# Altium footprint library Connectors_Old.PcbLib: 246 footprints (part 2 of 18)
Each footprint in its own frame and in the unit in brackets; x right, y up, seen from the top. Pads: shape width x height; smd on the part's side, far side on the other; paste and mask are expansions set on the pad; w line width, h text height; cw(c..) or ccw(c..) is an arc to the next point about the centre after c.
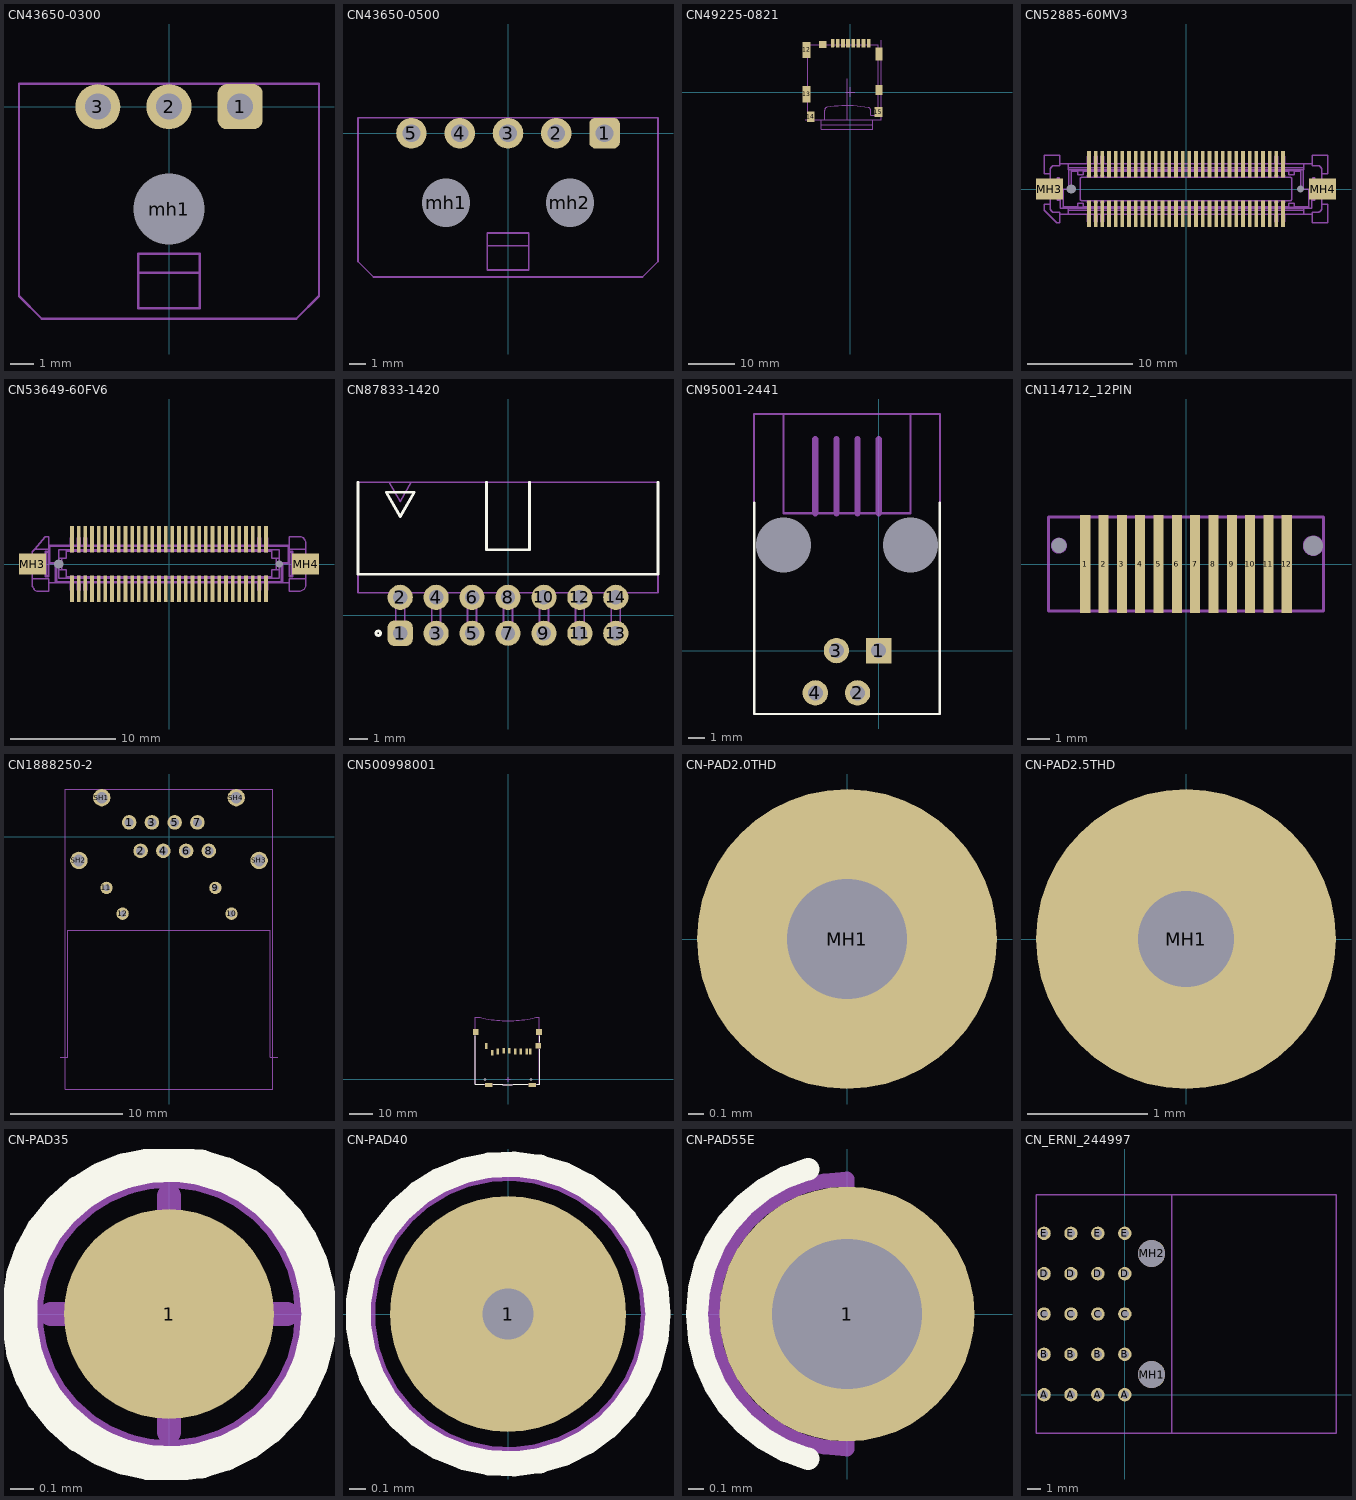
[diagram p1: the footprints below, top view; thin cyan lines are the x and y axes]

## CN43650-0300 [mm] "CN 3 pin Male horizontal THT R3.0"
height 9.4
pads (4):
  rrect40% 1.9x1.9 hole 1.1: 1(3,0)
  round 1.9 hole 1.1: 2(0,0) 3(-3,0)
  round 2.9 hole 3 unplated mask+0.2: mh1(0,-4.318)
Mechanical 13:
  lines w0.1: -1.3,-7 1.3,-7 ; -6.322,-7.978 -5.362,-8.938 5.362,-8.938 6.322,-7.978 6.322,0.962 -6.322,0.962 -6.322,-7.978 ; -1.3,-8.5 -1.3,-6.2 1.3,-6.2 1.3,-8.5 -1.3,-8.5
3D body: height 5.59, standoff -3.16, extent -6.325,-8.938 6.325,0.962

## CN43650-0500 [mm] "CN 5 pin Male horizontal THT R3.0"
height 9.4
pads (7):
  rrect40% 1.9x1.9 hole 1.1: 1(6,0)
  round 1.9 hole 1.1: 2(3,0) 3(0,0) 4(-3,0) 5(-6,0)
  round 2.9 hole 3 unplated mask+0.2: mh1(-3.85,-4.318) mh2(3.85,-4.318)
Mechanical 13:
  lines w0.1: -1.3,-7 1.3,-7 ; -9.322,-7.978 -8.362,-8.938 8.362,-8.938 9.322,-7.978 9.322,0.962 -9.322,0.962 -9.322,-7.978 ; -1.3,-8.5 -1.3,-6.2 1.3,-6.2 1.3,-8.5 -1.3,-8.5
3D body: height 5.59, standoff -3.16, extent -9.32,-8.938 9.32,0.962

## CN49225-0821 [mm] "Molex micro SD 49225-0821"
height 2
pads (15):
  rrect50% 0.8x1.8 smd: 1(-3.75,10.475)
  rect 0.8x1.8 smd: 2(-2.65,10.475) 3(-1.55,10.475) 4(-0.45,10.475) 5(0.65,10.475) 6(1.75,10.475) 7(2.85,10.475) 8(3.95,10.475)
  rect 1.55x2.1 smd: 9(6.15,0.45)
  rect 1.55x2.8 smd: 10(6.15,8.15)
  rect 1.6x1.55 smd: 11(-5.85,10.2)
  rect 1.7x3.4 smd: 12(-9.35,9.05)
  rect 1.7x3.6 smd: 13(-9.35,-0.475)
  rect 1.7x2.2 smd: 14(-8.45,-5.275) 15(6.05,-4.275)
Mechanical 13:
  lines w0.1: -9.15,-1.7 -9.625,-1.7 -9.75,-1.575 -9.75,0.575 -9.625,0.7 -9.15,0.7 ; -9.15,7.95 -9.625,7.95 -9.75,8.075 -9.75,10.025 -9.615,10.16 -9.15,10.16 ; -8.35,-4.65 -8.9,-4.65 -9.05,-4.8 -9.05,-5.8 -8.91,-5.94 -8.35,-5.94 ; -6.45,10.16 -6.45,10.55 -6.35,10.65 -5.55,10.65 -5.45,10.55 -5.45,10.16 ; 3.899,-3.355 cw(c3.825,-3.925) 4.4,-3.925 4.4,-4.94 6.05,-4.94 6.21,-4.94 6.35,-4.8 6.35,-3.8 6.2,-3.65 5.65,-3.65 ; 3.9,-3.353 ccw(c-0.684,-27.93) -4.999,-3.305 ccw(c-4.925,-3.875) -5.5,-3.875 -5.5,-5.94 -8.35,-5.94 ; 5.65,-4.94 5.65,-3.525 6.05,-3.525 6.05,10.16 -9.15,10.16 ; 6.05,-0.3 6.25,-0.3 6.35,-0.2 6.35,1.1 6.25,1.2 6.05,1.2 ; 6.05,7.05 6.25,7.05 6.35,7.15 6.35,8.95 6.25,9.05 6.05,9.05 ; -9.15,10.16 -9.15,-4.525 -8.35,-4.525 -8.35,-5.94
Mechanical 15:
  lines w0.1: -9.6,-5.94 6.65,-5.94 6.65,11.1 ; -6.18,-7 4.82,-7 ; -6.18,-5.99 -6.18,-7.95 4.82,-7.95 4.82,-5.94 ; -0.68,-6 -0.68,2.9
  lines w0.127: -1,0 1,0 ; 0,-1 0,1
  text "CARD LOCKED" at -4.35,-7.825 h0.7
  text "CARD PUSHED" at -4.375,-6.825 h0.7
3D body: height 1.99, standoff 0.01, extent -9.6,-5.94 6.5,11.11

## CN52885-60MV3 [mm] "Molex 52885 60pin vertical male 3mm R0.635mm"
height 3
pads (64):
  rect 0.35x2.5 smd: 1(-9.207,-2.35) 2(-9.207,2.35) 3(-8.572,-2.35) 4(-8.572,2.35) 5(-7.938,-2.35) 6(-7.938,2.35) 7(-7.302,-2.35) 8(-7.302,2.35) 9(-6.667,-2.35) 10(-6.667,2.35) 11(-6.032,-2.35) 12(-6.032,2.35) 13(-5.397,-2.35) 14(-5.397,2.35) 15(-4.763,-2.35) 16(-4.763,2.35) 17(-4.127,-2.35) 18(-4.127,2.35) 19(-3.492,-2.35) 20(-3.492,2.35) 21(-2.857,-2.35) 22(-2.857,2.35) 23(-2.222,-2.35) 24(-2.222,2.35) 25(-1.587,-2.35) 26(-1.587,2.35) 27(-0.953,-2.35) 28(-0.953,2.35) 29(-0.318,-2.35) 30(-0.318,2.35) 31(0.318,-2.35) 32(0.318,2.35) 33(0.953,-2.35) 34(0.953,2.35) 35(1.587,-2.35) 36(1.587,2.35) 37(2.222,-2.35) 38(2.222,2.35) 39(2.857,-2.35) 40(2.857,2.35) 41(3.492,-2.35) 42(3.492,2.35) 43(4.127,-2.35) 44(4.127,2.35) 45(4.763,-2.35) 46(4.763,2.35) 47(5.397,-2.35) 48(5.397,2.35) 49(6.032,-2.35) 50(6.032,2.35) 51(6.667,-2.35) 52(6.667,2.35) 53(7.302,-2.35) 54(7.302,2.35) 55(7.938,-2.35) 56(7.938,2.35) 57(8.572,-2.35) 58(8.572,2.35) 59(9.207,-2.35) 60(9.207,2.35)
  round 0 hole 0.9 unplated mask+0.7: MH1(-10.86,0)
  round 0 hole 0.7 unplated mask+0.6: MH2(10.86,0)
  rect 2.55x2 smd: MH3(-12.95,0) MH4(12.95,0)
Mechanical 13:
  drawing of 301 lines, arcs and shapes, not listed
3D body: height 3.2, standoff 0.8, extent 9.053,1.098 9.353,1.298
3D body: height 3.2, standoff 0.8, extent 9.049,-1.3 9.349,-1.1
3D body: height 3.2, standoff 0.8, extent 8.418,1.098 8.718,1.298
3D body: height 3.2, standoff 0.8, extent 8.414,-1.3 8.714,-1.1
3D body: height 3.2, standoff 0.8, extent 7.783,1.098 8.083,1.298
3D body: height 3.2, standoff 0.8, extent 7.779,-1.3 8.079,-1.1
3D body: height 3.2, standoff 0.8, extent 7.148,1.098 7.448,1.298
3D body: height 3.2, standoff 0.8, extent 7.144,-1.3 7.444,-1.1
3D body: height 3.2, standoff 0.8, extent 6.513,1.098 6.813,1.298
3D body: height 3.2, standoff 0.8, extent 6.509,-1.3 6.809,-1.1
3D body: height 3.2, standoff 0.8, extent 5.878,1.098 6.178,1.298
3D body: height 3.2, standoff 0.8, extent 5.874,-1.3 6.174,-1.1
3D body: height 3.2, standoff 0.8, extent 5.243,1.098 5.543,1.298
3D body: height 3.2, standoff 0.8, extent 5.239,-1.3 5.539,-1.1
3D body: height 3.2, standoff 0.8, extent 4.608,1.098 4.908,1.298
3D body: height 3.2, standoff 0.8, extent 4.604,-1.3 4.904,-1.1
3D body: height 3.2, standoff 0.8, extent 3.973,1.098 4.273,1.298
3D body: height 3.2, standoff 0.8, extent 3.969,-1.3 4.269,-1.1
3D body: height 3.2, standoff 0.8, extent 3.338,1.098 3.638,1.298
3D body: height 3.2, standoff 0.8, extent 3.334,-1.3 3.634,-1.1
3D body: height 3.2, standoff 0.8, extent 2.703,1.098 3.003,1.298
3D body: height 3.2, standoff 0.8, extent 2.699,-1.3 2.999,-1.1
3D body: height 3.2, standoff 0.8, extent 2.068,1.098 2.368,1.298
3D body: height 3.2, standoff 0.8, extent 2.064,-1.3 2.364,-1.1
3D body: height 3.2, standoff 0.8, extent 1.433,1.098 1.733,1.298
3D body: height 3.2, standoff 0.8, extent 1.429,-1.3 1.729,-1.1
3D body: height 3.2, standoff 0.8, extent 0.798,1.098 1.098,1.298
3D body: height 3.2, standoff 0.8, extent 0.794,-1.3 1.094,-1.1
3D body: height 3.2, standoff 0.8, extent 0.163,1.098 0.463,1.298
3D body: height 3.2, standoff 0.8, extent 0.159,-1.3 0.459,-1.1
3D body: height 3.2, standoff 0.8, extent -0.472,1.098 -0.172,1.298
3D body: height 3.2, standoff 0.8, extent -0.476,-1.3 -0.176,-1.1
3D body: height 3.2, standoff 0.8, extent -1.107,1.098 -0.807,1.298
3D body: height 3.2, standoff 0.8, extent -1.111,-1.3 -0.811,-1.1
3D body: height 3.2, standoff 0.8, extent -1.742,1.098 -1.442,1.298
3D body: height 3.2, standoff 0.8, extent -1.746,-1.3 -1.446,-1.1
3D body: height 3.2, standoff 0.8, extent -2.377,1.098 -2.077,1.298
3D body: height 3.2, standoff 0.8, extent -2.381,-1.3 -2.081,-1.1
3D body: height 3.2, standoff 0.8, extent -3.012,1.098 -2.712,1.298
3D body: height 3.2, standoff 0.8, extent -3.016,-1.3 -2.716,-1.1
3D body: height 3.2, standoff 0.8, extent -3.647,1.098 -3.347,1.298
3D body: height 3.2, standoff 0.8, extent -3.651,-1.3 -3.351,-1.1
3D body: height 3.2, standoff 0.8, extent -4.282,1.098 -3.982,1.298
3D body: height 3.2, standoff 0.8, extent -4.286,-1.3 -3.986,-1.1
3D body: height 3.2, standoff 0.8, extent -4.917,1.098 -4.617,1.298
3D body: height 3.2, standoff 0.8, extent -4.921,-1.3 -4.621,-1.1
3D body: height 3.2, standoff 0.8, extent -5.552,1.098 -5.252,1.298
3D body: height 3.2, standoff 0.8, extent -5.556,-1.3 -5.256,-1.1
3D body: height 3.2, standoff 0.8, extent -6.187,1.098 -5.887,1.298
3D body: height 3.2, standoff 0.8, extent -6.191,-1.3 -5.891,-1.1
3D body: height 3.2, standoff 0.8, extent -6.822,1.098 -6.522,1.298
3D body: height 3.2, standoff 0.8, extent -6.826,-1.3 -6.526,-1.1
3D body: height 3.2, standoff 0.8, extent -7.457,1.098 -7.157,1.298
3D body: height 3.2, standoff 0.8, extent -7.461,-1.3 -7.161,-1.1
3D body: height 3.2, standoff 0.8, extent -9.366,-1.3 -9.066,-1.1
3D body: height 3.2, standoff 0.8, extent -8.731,-1.3 -8.431,-1.1
3D body: height 3.2, standoff 0.8, extent -8.096,-1.3 -7.796,-1.1
3D body: height 3.2, standoff 0.8, extent -8.092,1.098 -7.792,1.298
3D body: height 3.2, standoff 0.8, extent -8.727,1.098 -8.427,1.298
3D body: height 3.2, standoff 0.8, extent -9.362,1.098 -9.062,1.298
3D body: height 4, standoff 0.8, extent -10.023,-1.11 10.014,1.106
3D body: height 4, standoff 0.8, extent -11.164,-2.402 11.156,-1.702
3D body: height 4, standoff 0.8, extent -11.164,1.698 11.156,2.398
3D body: height 3.2, standoff 0.8, extent 10.856,-2.402 12.863,2.398
3D body: height 3.2, standoff 0.8, extent -12.863,-2.402 -10.856,2.398
3D body: height 0.8, standoff 0, extent -13.464,-3.202 13.456,3.198

## CN53649-60FV6 [mm] "Molex 53649 60pin vertical male H6mm R0.635mm"
height 6
pads (64):
  rect 0.35x2.5 smd: 1(-9.207,2.35) 2(-9.207,-2.35) 3(-8.572,2.35) 4(-8.572,-2.35) 5(-7.938,2.35) 6(-7.938,-2.35) 7(-7.302,2.35) 8(-7.302,-2.35) 9(-6.667,2.35) 10(-6.667,-2.35) 11(-6.032,2.35) 12(-6.032,-2.35) 13(-5.397,2.35) 14(-5.397,-2.35) 15(-4.763,2.35) 16(-4.763,-2.35) 17(-4.127,2.35) 18(-4.127,-2.35) 19(-3.492,2.35) 20(-3.492,-2.35) 21(-2.857,2.35) 22(-2.857,-2.35) 23(-2.222,2.35) 24(-2.222,-2.35) 25(-1.587,2.35) 26(-1.587,-2.35) 27(-0.953,2.35) 28(-0.953,-2.35) 29(-0.318,2.35) 30(-0.318,-2.35) 31(0.318,2.35) 32(0.318,-2.35) 33(0.953,2.35) 34(0.953,-2.35) 35(1.587,2.35) 36(1.587,-2.35) 37(2.222,2.35) 38(2.222,-2.35) 39(2.857,2.35) 40(2.857,-2.35) 41(3.492,2.35) 42(3.492,-2.35) 43(4.127,2.35) 44(4.127,-2.35) 45(4.763,2.35) 46(4.763,-2.35) 47(5.397,2.35) 48(5.397,-2.35) 49(6.032,2.35) 50(6.032,-2.35) 51(6.667,2.35) 52(6.667,-2.35) 53(7.302,2.35) 54(7.302,-2.35) 55(7.938,2.35) 56(7.938,-2.35) 57(8.572,2.35) 58(8.572,-2.35) 59(9.207,2.35) 60(9.207,-2.35)
  round 0 hole 0.9 unplated mask+0.7: MH1(-10.476,0)
  round 0 hole 0.7 unplated mask+0.6: MH2(10.445,0)
  rect 2.55x2 smd: MH3(-12.95,0) MH4(12.95,0)
Mechanical 13:
  drawing of 233 lines, arcs and shapes, not listed
3D body: height 7.5, standoff 5.8, extent 9.075,1.182 9.345,1.342
3D body: height 7.5, standoff 5.8, extent 9.075,-1.328 9.345,-1.168
3D body: height 7.5, standoff 5.8, extent 8.44,1.182 8.71,1.342
3D body: height 7.5, standoff 5.8, extent 8.44,-1.328 8.71,-1.168
3D body: height 7.5, standoff 5.8, extent 7.805,1.182 8.075,1.342
3D body: height 7.5, standoff 5.8, extent 7.805,-1.328 8.075,-1.168
3D body: height 7.5, standoff 5.8, extent 7.17,1.182 7.44,1.342
3D body: height 7.5, standoff 5.8, extent 7.17,-1.328 7.44,-1.168
3D body: height 7.5, standoff 5.8, extent 6.535,1.182 6.805,1.342
3D body: height 7.5, standoff 5.8, extent 6.535,-1.328 6.805,-1.168
3D body: height 7.5, standoff 5.8, extent 5.905,1.182 6.175,1.342
3D body: height 7.5, standoff 5.8, extent 5.905,-1.328 6.175,-1.168
3D body: height 7.5, standoff 5.8, extent 5.27,1.182 5.54,1.342
3D body: height 7.5, standoff 5.8, extent 5.27,-1.328 5.54,-1.168
3D body: height 7.5, standoff 5.8, extent 4.635,1.182 4.905,1.342
3D body: height 7.5, standoff 5.8, extent 4.635,-1.328 4.905,-1.168
3D body: height 7.5, standoff 5.8, extent 3.975,1.182 4.245,1.342
3D body: height 7.5, standoff 5.8, extent 3.975,-1.328 4.245,-1.168
3D body: height 7.5, standoff 5.8, extent 3.34,1.182 3.61,1.342
3D body: height 7.5, standoff 5.8, extent 3.34,-1.328 3.61,-1.168
3D body: height 7.5, standoff 5.8, extent 2.705,1.182 2.975,1.342
3D body: height 7.5, standoff 5.8, extent 2.705,-1.328 2.975,-1.168
3D body: height 7.5, standoff 5.8, extent 2.07,1.182 2.34,1.342
3D body: height 7.5, standoff 5.8, extent 2.07,-1.328 2.34,-1.168
3D body: height 7.5, standoff 5.8, extent 1.435,1.182 1.705,1.342
3D body: height 7.5, standoff 5.8, extent 1.435,-1.328 1.705,-1.168
3D body: height 7.5, standoff 5.8, extent 0.805,1.182 1.075,1.342
3D body: height 7.5, standoff 5.8, extent 0.805,-1.328 1.075,-1.168
3D body: height 7.5, standoff 5.8, extent 0.17,1.182 0.44,1.342
3D body: height 7.5, standoff 5.8, extent 0.17,-1.328 0.44,-1.168
3D body: height 7.5, standoff 5.8, extent -0.465,1.182 -0.195,1.342
3D body: height 7.5, standoff 5.8, extent -0.465,-1.328 -0.195,-1.168
3D body: height 7.5, standoff 5.8, extent -1.095,1.182 -0.825,1.342
3D body: height 7.5, standoff 5.8, extent -1.095,-1.328 -0.825,-1.168
3D body: height 7.5, standoff 5.8, extent -1.73,1.182 -1.46,1.342
3D body: height 7.5, standoff 5.8, extent -1.73,-1.328 -1.46,-1.168
3D body: height 7.5, standoff 5.8, extent -2.365,1.182 -2.095,1.342
3D body: height 7.5, standoff 5.8, extent -2.365,-1.328 -2.095,-1.168
3D body: height 7.5, standoff 5.8, extent -2.995,1.182 -2.725,1.342
3D body: height 7.5, standoff 5.8, extent -2.995,-1.328 -2.725,-1.168
3D body: height 7.5, standoff 5.8, extent -3.63,1.182 -3.36,1.342
3D body: height 7.5, standoff 5.8, extent -3.63,-1.328 -3.36,-1.168
3D body: height 7.5, standoff 5.8, extent -4.265,1.182 -3.995,1.342
3D body: height 7.5, standoff 5.8, extent -4.265,-1.328 -3.995,-1.168
3D body: height 7.5, standoff 5.8, extent -4.897,1.182 -4.627,1.342
3D body: height 7.5, standoff 5.8, extent -4.897,-1.328 -4.627,-1.168
3D body: height 7.5, standoff 5.8, extent -5.532,1.182 -5.262,1.342
3D body: height 7.5, standoff 5.8, extent -5.532,-1.328 -5.262,-1.168
3D body: height 7.5, standoff 5.8, extent -6.167,1.182 -5.897,1.342
3D body: height 7.5, standoff 5.8, extent -6.167,-1.328 -5.897,-1.168
3D body: height 7.5, standoff 5.8, extent -6.802,1.182 -6.532,1.342
3D body: height 7.5, standoff 5.8, extent -6.802,-1.328 -6.532,-1.168
3D body: height 7.5, standoff 5.8, extent -7.437,1.182 -7.167,1.342
3D body: height 7.5, standoff 5.8, extent -7.437,-1.328 -7.167,-1.168
3D body: height 7.5, standoff 5.8, extent -8.065,1.182 -7.795,1.342
3D body: height 7.5, standoff 5.8, extent -8.065,-1.328 -7.795,-1.168
3D body: height 8, standoff 5.8, extent -11.415,-1.783 11.415,1.797
3D body: height 5.8, standoff 2.25, extent -12.96,-1.783 12.96,1.797
3D body: height 2.25, standoff 0, extent -12.971,-2.605 12.973,2.618
3D body: height 7.5, standoff 5.8, extent -9.342,1.182 -9.072,1.342
3D body: height 7.5, standoff 5.8, extent -8.707,1.182 -8.437,1.342
3D body: height 7.5, standoff 5.8, extent -8.707,-1.328 -8.437,-1.168
3D body: height 7.5, standoff 5.8, extent -9.342,-1.328 -9.072,-1.168

## CN87833-1420 [mm] "Connector Male Header, Thru-Hole; 14 pin; Horizontal; R2mm; Body 16.65 x 6.4 x 6.3 mm (LxWxH)"
height 6.3
pads (14):
  rrect50% 1.4x1.4 hole 0.8: 1(-6,-1)
  round 1.4 hole 0.8: 2(-6,1) 3(-4,-1) 4(-4,1) 5(-2,-1) 6(-2,1) 7(0,-1) 8(0,1) 9(2,-1) 10(2,1) 11(4,-1) 12(4,1) 13(6,-1) 14(6,1)
Top Overlay:
  circle w0.15: c-7.225,-1 r0.125
  lines w0.15: -8.35,7.4 -8.35,2.286 8.35,2.286 8.35,7.4 ; -1.2,7.4 -1.2,3.65 1.2,3.65 1.2,7.4 ; -6.775,6.85 -6,5.5 -5.225,6.85 -6.775,6.85
Mechanical 13:
  lines w0.1: -6.602,7.399 -6,6.325 -5.393,7.41 ; -6.25,1.25 -6.25,-1.25 -5.75,-1.25 -5.75,1.25 ; -4.25,1.25 -4.25,-1.25 -3.75,-1.25 -3.75,1.25 ; -2.25,1.25 -2.25,-1.25 -1.75,-1.25 -1.75,1.25 ; -1.2,7.4 -1.2,3.65 1.2,3.65 1.2,7.4 ; -0.25,1.25 -0.25,-1.25 0.25,-1.25 0.25,1.25 ; 1.75,1.25 1.75,-1.25 2.25,-1.25 2.25,1.25 ; 3.75,1.25 3.75,-1.25 4.25,-1.25 4.25,1.25 ; 5.75,1.25 5.75,-1.25 6.25,-1.25 6.25,1.25 ; -8.35,1.25 -8.35,7.4 8.35,7.4 8.35,1.25 -8.35,1.25
  text "13" at 6.6,-1.6 h1.3
  text "1" at -7.6,-1.6 h1.3
3D body: height 6.32, standoff -2.14, extent -8.325,-1.25 8.325,7.4

## CN95001-2441 [mil] "Molex 950012441"
pads (6):
  rect 60x60 hole 35.43: 1(0,0)
  round 60 hole 35.43: 2(-50,-100) 3(-100,0) 4(-150,-100)
  round 0 hole 129.92 unplated: 5(75,250) 6(-225,250)
Top Overlay:
  lines w5.91: -295,350 -295,-150 145,-150 145,350
Mechanical 13:
  lines w5: -225,560 75,560 ; -225,560 -225,325 75,325 75,560 ; -225,560 -295,560 -295,-150 145,-150 145,560 75,560
  lines w15: -150,325 -150,500 ; -100,325 -100,500 ; -50,325 -50,500 ; 0,325 0,500
3D body: height 452.76, standoff 0, extent -295,-150 145,560

## CN114712_12PIN [mm] "Erni 114712 12pin vertical 4.35mm R0.8mm"
height 4.35
pads (14):
  rect 0.44x4.3 smd: 1(-4.4,0) 2(-3.6,0) 3(-2.8,0) 4(-2,0) 5(-1.2,0) 6(-0.4,0) 7(0.4,0) 8(1.2,0) 9(2,0) 10(2.8,0) 11(3.6,0) 12(4.4,0)
  round 0 hole 0.65 unplated mask+0.6: MH1(-5.55,0.8)
  round 0 hole 0.85 unplated mask+0.6: MH2(5.55,0.8)
Mechanical 13:
  circle w0.102: c5.55,0.8 r0.4
  circle w0.102: c-5.55,0.8 r0.3
  lines w0.127: -6,-2.05 6,-2.05 6,2.05 -6,2.05 -6,-2.05
3D body: height 0, standoff -0.8, extent -5.856,0.494 -5.258,1.093
3D body: height 0, standoff -0.8, extent 5.142,0.392 5.939,1.191
3D body: height 4.35, standoff 0, extent -6,-2.05 6,2.05

## CN1888250-2 [mm] "Connector RJ45 for AMC 8pin pressfit 26.2x16.3x11.6"
height 7.38
pads (16):
  round 1.3 hole 0.8: 1(-3.556,1.27) 2(-2.54,-1.27) 3(-1.524,1.27) 4(-0.508,-1.27) 5(0.508,1.27) 6(1.524,-1.27) 7(2.54,1.27) 8(3.556,-1.27)
  round 1.1 hole 0.6: 9(4.14,-4.57) 10(5.58,-6.87) 11(-5.58,-4.57) 12(-4.14,-6.87)
  round 1.55 hole 1.05: SH1(-6,3.48) SH2(-8.045,-2.12) SH3(8.045,-2.12) SH4(6,3.48)
Mechanical 13:
  lines w0.1: -9.245,-22.52 -9.245,4.215 9.245,4.215 9.245,-22.52 -9.245,-22.52
Mechanical 15:
  lines w0.1: -9.7,-19.7 -9.05,-19.7 -9.05,-8.37 9.05,-8.37 9.05,-19.7 9.7,-19.7
  text "IZREZ PCBja" at -7.925,-10.8 h1.5
3D body: height 8.49, standoff -5.29, extent -9.245,-22.52 9.245,4.215

## CN500998001 [mm] "Molex SD 500998001"
pads (16):
  rrect50% 1.1x2.5 smd: 1(-6.875,11.6)
  rect 1.1x2.5 smd: 2(-4.375,12.1) 3(-1.875,12.4) 4(0.625,12.4) 5(3.125,12.1) 6(5.625,12.1) 7(8.125,12.1) 8(9.75,12.1) 9(-9.375,14.5)
  rect 3.3x1.7 smd: 10(-8.35,-2.5) 11(10.55,-2.5)
  rect 2.3x2.5 smd: 12(13.125,14.6)
  rect 2.5x2.6 smd: 13(13.4,20.6) 14(-14,20.6)
  round 0 hole 1.4 unplated: MH1(-10,0) MH2(10,0)
Top Overlay:
  lines w0.15: -14.3,19 -14.3,-2 -10.3,-2 ; -6.4,-2 -2.5,-2 -2.2,-2.3 1.9,-2.3 2.2,-2 8.6,-2 ; 12.4,-2 13.7,-2 13.7,13.1 ; 13.7,16.2 13.7,19
Mechanical 13:
  lines w0.127: 11.997,26.9 13.65,26.9 13.65,-2 2.2,-2 1.95,-2.25 -2.25,-2.25 -2.5,-2 -7.275,-2 -14.25,-2 -14.25,26.9 -11.95,26.9 ccw(c0,75.75) 11.997,26.912
Mechanical 15:
  lines w0.127: -1,0 1,0 ; 0,-1 0,1
3D body: height 0, standoff 0, extent -14.25,-2.25 13.65,26.912

## CN-PAD2.0THD [mm] "Connector pad 2.0mm ThroughHole"
pads (1):
  round 2 hole 0.8 mask+0.1: MH1(0,0)

## CN-PAD2.5THD [mm] "Connector pad 2.5mm ThroughHole"
pads (1):
  round 2.5 hole 0.8 mask+0.1: MH1(0,0)

## CN-PAD35 [mil] "Connector pad 0.9mm"
pads (1):
  round 35 smd paste-100: 1(0,0)
Top Overlay:
  circle w5.91: c0,0 r25
Mechanical 13:
  circle w3.94: c0,0 r23
Mechanical 15:
  lines w4: -19.68,0 19.68,0 ; 0,-19.68 0,19.68

## CN-PAD40 [mil] "Connector pad 1.0mm with via 0.3mm"
pads (1):
  round 55 smd paste-100: 1(0,0)
via 0,0 diameter 23.62 hole 11.81
Top Overlay:
  circle w5.91: c0,0 r35
Mechanical 13:
  circle w3.94: c0,0 r33
Mechanical 15:
  lines w4: -19.68,0 19.68,0 ; 0,-19.68 0,19.68

## CN-PAD55E [mm] "Connector pad 1.4mm"
pads (1):
  round 1.7 / inner round 1.4 / far side round 1.4 hole 1: 1(0,0)
Top Overlay:
  lines w0.15: -0.259,-0.966 cw(c0,0) -0.259,0.966
Mechanical 13:
  lines w0.1: 0,-0.9 cw(c0,0) 0,0.9
  lines w0.102: 0,-0.9 0,0.9
Mechanical 15:
  lines w0.102: -0.5,0 0.5,0 ; 0,-0.5 0,0.5

## CN_ERNI_244997 [mm] "CN power 5pin 22.3x17.7x14.3mm"
height 9.7
pads (22):
  round 1 hole 0.6: A(-6,0) A(-4,0) A(-2,0) A(0,0) B(-6,3) B(-4,3) B(-2,3) B(0,3) C(-6,6) C(-4,6) C(-2,6) C(0,6) D(-6,9) D(-4,9) D(-2,9) D(0,9) E(-6,12) E(-4,12) E(-2,12) E(0,12)
  round 2 hole 2 unplated: MH1(2,1.5) MH2(2,10.5)
Mechanical 13:
  lines w0.1: -6.6,-2.85 -6.6,14.85 15.7,14.85 15.7,-2.85 -6.6,-2.85
Mechanical 15:
  lines w0.1: 3.5,-2.85 3.5,14.85
3D body: height 9.72, standoff -4.58, extent -6.6,-2.85 15.7,14.85